# Altium footprint library fszhang.PcbLib: 1032 footprints (part 62 of 66)
Each footprint in its own frame and in the unit in brackets; x right, y up, seen from the top. Pads: shape width x height; smd on the part's side, far side on the other; paste and mask are expansions set on the pad; w line width, h text height; cw(c..) or ccw(c..) is an arc to the next point about the centre after c.
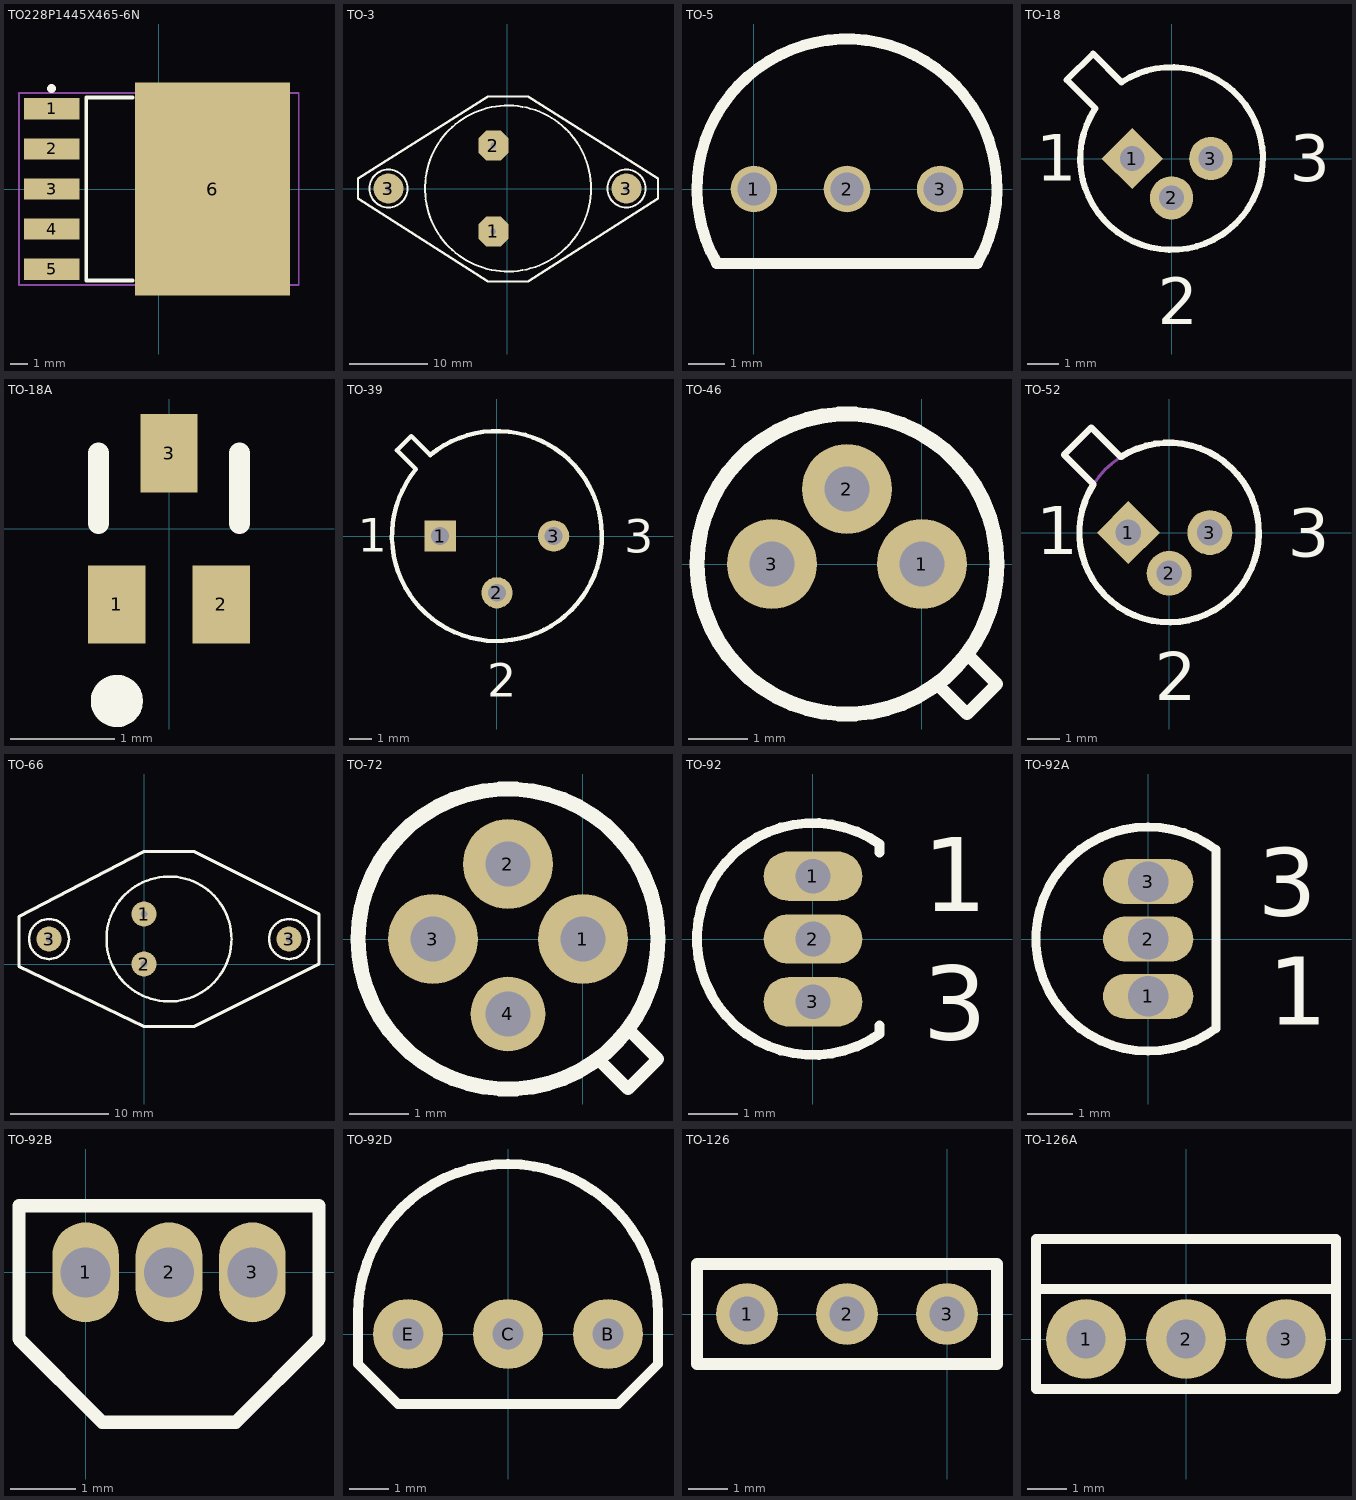
[diagram p61: the footprints below, top view; thin cyan lines are the x and y axes]

## TO228P1445X465-6N [mm] "D2-PAK, 6-Pads, Body 10.4x10.4mm (max), IPC Medium Density"
height 4.65
pads (6):
  rect 3.15x1.2 smd: 1(-6.1,4.56) 2(-6.1,2.28) 3(-6.1,0) 4(-6.1,-2.28) 5(-6.1,-4.56)
  rect 8.8x12.1 smd: 6(3.048,0)
Top Overlay:
  circle w0.25: c-6.1,5.71 r0.125
  lines w0.2: -1.5,-5.2 -4.125,-5.2 -4.125,5.2 -1.5,5.2
Mechanical 15:
  lines w0.1: -0.5,0 0.5,0 ; 0,-0.5 0,0.5 ; -7.95,-5.45 7.95,-5.45 7.95,5.45 -7.95,5.45 -7.95,-5.45

## TO-3 [mil]
pads (4):
  oct 150x150 hole 28: 1(-70,-215) 2(-70,215)
  round 150 hole 28: 3(-595,0) 3(595,0)
Top Overlay:
  circle w10: c-595,0 r95
  circle w10: c595,0 r95
  circle w10: c3,0 r415
  lines w12: -747,-50 -747,50 -97,460 103,460 753,50 753,-50 103,-465 -97,-465 -747,-50

## TO-5 [mm]
pads (3):
  round 1.27 hole 0.9: 1(0,0) 2(2.54,0) 3(5.08,0)
Top Overlay:
  lines w0.305: -1.016,-2.032 cw(c2.54,0) 6.096,-2.032 -1.016,-2.032

## TO-18 [mm] "Can; 3 Leads; Pin Circle Dia. 2.54 mm; Lead Dia. 0.48 mm (max)"
height 5.33
pads (3):
  rect 1.4x1.4 hole 0.8 rot 45: 1(-1.27,0)
  round 1.4 hole 0.8: 2(0,-1.27) 3(1.27,0)
Top Overlay:
  lines w0.2: -3.386,2.537 -2.537,3.386 -1.618,2.467 cw(c0,0) -2.467,1.618 -3.386,2.537
  text "1" at -4.38,-0.719 h1.5
  text "2" at -0.443,-5.355 h1.5
  text "3" at 3.812,-0.742 h1.5

## TO-18A [mm] "SC-89; 3 Flat Leads; Body 1.6 x 1.6 x 0.7 mm, inc leads (LxWxH typ)"
height 0.8
pads (3):
  rect 0.55x0.75 smd: 1(-0.5,-0.725) 2(0.5,-0.725) 3(0,0.725)
Top Overlay:
  circle w0.25: c-0.5,-1.65 r0.125
  lines w0.2: -0.676,0.05 -0.676,0.725 ; 0.675,0.05 0.675,0.725

## TO-39 [mm] "Can; 3 Leads; Pin Circle Dia. 5.08 mm; Lead Dia. 0.48 mm (max)"
height 4.55
pads (3):
  rect 1.4x1.4 hole 0.8: 1(-2.54,0)
  round 1.4 hole 0.8: 2(0,-2.54) 3(2.54,0)
Top Overlay:
  lines w0.2: -4.475,3.838 -3.626,2.99 ccw(c0,0) -2.99,3.626 -3.838,4.475 -4.475,3.838
  text "1" at -6.219,-0.697 h1.5
  text "2" at -0.433,-7.203 h1.5
  text "3" at 5.712,-0.751 h1.5

## TO-46 [mil]
pads (3):
  round 60 hole 30: 1(0,0) 2(-50,50) 3(-100,0)
Top Overlay:
  circle w10: c-50,0 r100
  lines w8: 10,-80 30,-100 50,-80 30,-60

## TO-52 [mm] "Can; 3 Leads; Pin Circle Dia. 2.54 mm"
height 2.67
pads (3):
  rect 1.4x1.4 hole 0.8 rot 45: 1(-1.27,0)
  round 1.4 hole 0.8: 2(0,-1.27) 3(1.27,0)
Top Overlay:
  lines w0.2: -3.277,2.429 -2.429,3.277 -1.51,2.358 cw(c0,0) -2.358,1.51 -3.277,2.429
  text "1" at -4.153,-0.68 h1.5
  text "2" at -0.442,-5.239 h1.5
  text "3" at 3.706,-0.751 h1.5
Mechanical 1:
  circle w0.1: c0,0 r2.8

## TO-66 [mil]
pads (4):
  round 100 hole 28: 1(0,200) 2(0,0) 3(-380,100) 3(580,100)
Top Overlay:
  circle w10: c580,100 r80
  circle w10: c-380,100 r80
  circle w10: c100,100 r250
  lines w12: -500,-10 0,-250 200,-250 700,0 700,200 200,450 0,450 -500,190 -500,-10

## TO-72 [mil]
pads (4):
  round 60 hole 30: 1(0,0) 2(-50,50) 3(-100,0)
  round 50 hole 30: 4(-50,-50)
Top Overlay:
  circle w10: c-50,0 r100
  lines w8: 10,-80 30,-100 50,-80 30,-60

## TO-92 [mm] "TO, Flat Index; 3 In-Line, Axial Leads; Body Dia. 4.6mm; Leads 0.41 x 0.39 mm (max)"
height 4.7
pads (3):
  oval 2x1 hole 0.7: 1(0,1.27) 2(0,0) 3(0,-1.27)
Top Overlay:
  lines w0.2: 1.35,-1.75 1.35,-1.92 cw(c0,0) 1.35,1.92 1.35,1.75
  text "3" at 2.224,-2.035 h1.5
  text "1" at 2.224,0.56 h1.5

## TO-92A [mm] "TO, Flat Index; 3 In-Line, Axial Leads; Body Dia. 4.5mm; Leads 0.51 x 0.48 mm (max)"
height 6.86
pads (3):
  oval 2x1 hole 0.9: 1(0,-1.27) 2(0,0) 3(0,1.27)
Top Overlay:
  lines w0.2: 1.5,-1.98 cw(c0,0) 1.5,1.98 1.5,-1.98
  text "1" at 2.66,-1.9 h1.5
  text "3" at 2.43,0.51 h1.5

## TO-92B [mil]
pads (3):
  oval 40x60 hole 30: 1(0,0) 2(50,0) 3(100,0)
Top Overlay:
  lines w8: -40,-40 -40,40 140,40 140,-40 90,-90 10,-90 -40,-40

## TO-92D [mil]
pads (3):
  round 70 hole 31.5: B(100,0) C(0,0) E(-100,0)
Top Overlay:
  lines w10: -150,-30 -150,20 cw(c0,20) 150,20 150,-30 110,-70 -110,-70 -150,-30

## TO-126 [mil]
pads (3):
  round 62 hole 35.43: 1(-200,0) 2(-100,0) 3(0,0)
Top Overlay:
  lines w12: -250,-50 50,-50 50,50 -250,50 -250,-50

## TO-126A [mil]
pads (3):
  round 80 hole 39: 1(-100,0) 2(0,0) 3(100,0)
Top Overlay:
  lines w10: 150,40 150,100 -150,100 -150,50 ; -150,50 150,50 150,-50 -150,-50 -150,50